# Altium footprint library Napelem_Inverter.PcbLib: 127 footprints (part 2 of 8)
Each footprint in its own frame and in the unit in brackets; x right, y up, seen from the top. Pads: shape width x height; smd on the part's side, far side on the other; paste and mask are expansions set on the pad; w line width, h text height; cw(c..) or ccw(c..) is an arc to the next point about the centre after c.
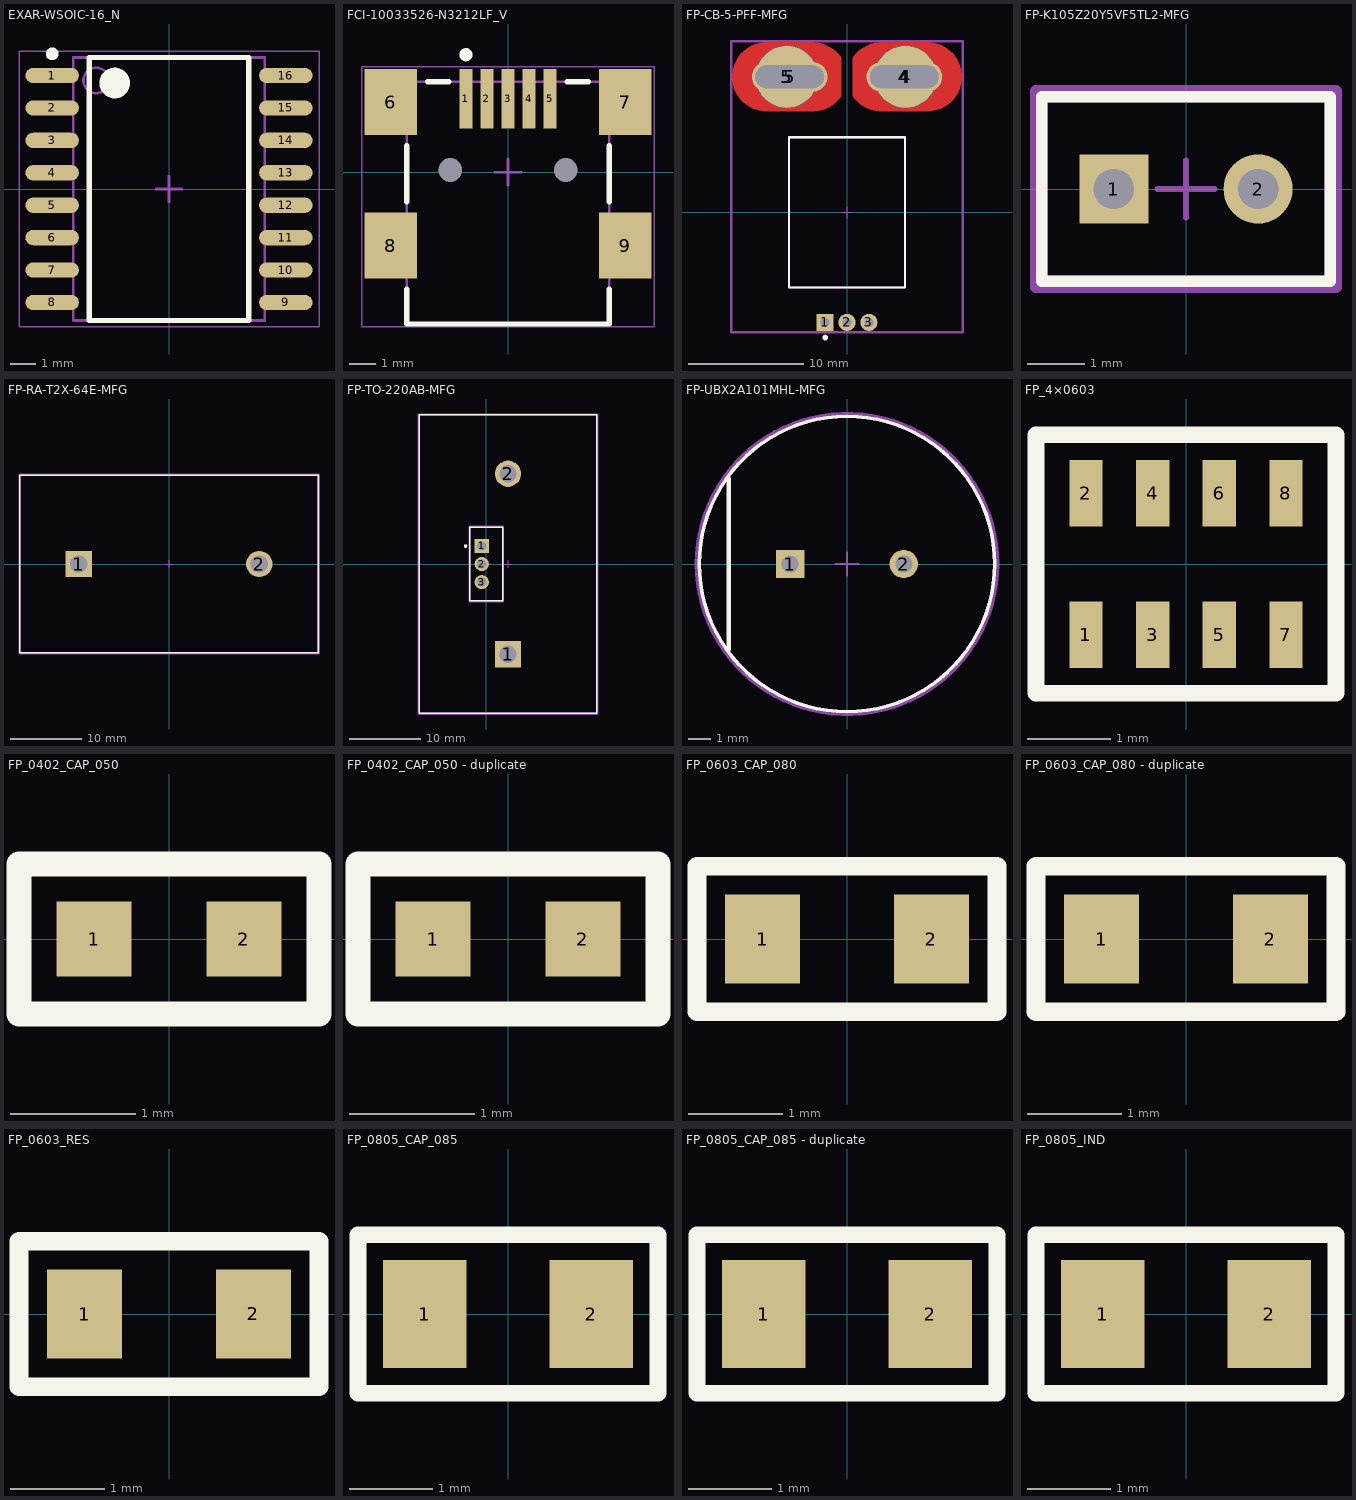
[diagram p1: the footprints below, top view; thin cyan lines are the x and y axes]

## EXAR-WSOIC-16_N [mm] "SOIC, 16-Leads, Body 10.30x7.50mm, Pitch 1.27mm, IPC Medium Density"
height 2.65
pads (16):
  oval 2.1x0.6 smd: 1(-4.575,4.445) 2(-4.575,3.175) 3(-4.575,1.905) 4(-4.575,0.635) 5(-4.575,-0.635) 6(-4.575,-1.905) 7(-4.575,-3.175) 8(-4.575,-4.445) 9(4.575,-4.445) 10(4.575,-3.175) 11(4.575,-1.905) 12(4.575,-0.635) 13(4.575,0.635) 14(4.575,1.905) 15(4.575,3.175) 16(4.575,4.445)
Top Overlay:
  circle w0.6: c-2.125,4.15 r0.3
  circle w0.25: c-4.575,5.295 r0.125
  lines w0.2: -3.125,-5.15 3.125,-5.15 3.125,5.15 -3.125,5.15 -3.125,-5.15
Mechanical 13:
  circle w0.1: c-2.85,4.25 r0.5
  lines w0.1: -3.75,-5.15 3.75,-5.15 3.75,5.15 -3.75,5.15 -3.75,-5.15
Mechanical 15:
  lines w0.05: -5.875,-5.4 5.875,-5.4 5.875,5.4 -5.875,5.4 -5.875,-5.4
  lines w0.1: -0.5,0 0.5,0 ; 0,-0.5 0,0.5
3D body: height 2.65, standoff 0.1, extent -3.75,-5.15 3.75,5.15

## FCI-10033526-N3212LF_V [mm] "SMD, 5-Leads, Body 9.2x7.7mm, Pitch 0.8mm"
height 3.95
pads (11):
  rect 0.5x2.25 smd: 1(-1.6,2.788) 2(-0.8,2.788) 3(0,2.788) 4(0.8,2.788) 5(1.6,2.788)
  rect 2x2.5 smd: 6(-4.45,2.663) 7(4.45,2.663) 8(-4.45,-2.787) 9(4.45,-2.787)
  round 0 hole 0.9 unplated: MH1(-2.2,0.083) MH2(2.2,0.083)
Top Overlay:
  circle w0.25: c-1.6,4.463 r0.125
  lines w0.2: -3.85,-4.437 -3.85,-5.767 3.85,-5.767 3.85,-4.437 ; -3.85,-1.137 -3.85,1.013 ; -3.05,3.433 -2.25,3.433 ; 2.25,3.433 3.05,3.433 ; 3.85,-1.137 3.85,1.013
Mechanical 13:
  lines w0.1: -3.85,-5.767 3.85,-5.767 3.85,3.433 -3.85,3.433 -3.85,-5.767
Mechanical 15:
  lines w0.05: -5.55,-5.867 -5.55,4.013 5.55,4.013 5.55,-5.867 -5.55,-5.867
  lines w0.1: -0.5,0 0.5,0 ; 0,-0.5 0,0.5
3D body "i10033526.stp": height 4.02, standoff -0.98, extent -4.95,-5.767 4.95,3.632

## FP-CB-5-PFF-MFG [mm]
pads (9):
  rect 1.5x1.5 hole 0.8 paste-1000 mask+0: 1(-1.91,-9.59)
  round 1.5 hole 0.8 paste-1000 mask+0: 2(0,-9.59) 3(1.91,-9.59)
  rrect100% 6.6x2.6 hole 2 slot 6 at 0 deg paste-1000 mask+0: 4(5,11.809) 5(-5,11.809)
  round 5.4 smd paste-1000 mask+0: 4(5.099,11.809) 5(-5.25,11.809)
  round 5.4 smd far side paste-1000 mask+0: 4(5.099,11.809) 5(-5.25,11.809)
Top Layer:
  region: -0.5,10.151 -0.602,9.997 -0.843,9.716 -1.116,9.467 -1.418,9.254 -1.744,9.079 -2.089,8.945 -2.448,8.855 -2.815,8.81 -3,8.81 -7,8.809 -7.236,8.809 -7.703,8.883 -8.152,9.029 -8.572,9.244 -8.954,9.521 -9.288,9.855 -9.566,10.237 -9.78,10.658 -9.926,11.107 -10,11.573 -10,12.046 -9.926,12.512 -9.78,12.961 -9.566,13.382 -9.288,13.764 -8.954,14.098 -8.572,14.375 -8.152,14.59 -7.703,14.736 -7.236,14.809 -7,14.809 -7,14.81 -3,14.809 -2.815,14.809 -2.448,14.764 -2.089,14.674 -1.744,14.54 -1.418,14.365 -1.116,14.152 -0.843,13.903 -0.602,13.622 -0.5,13.468
  region: 0.5,13.468 0.602,13.622 0.843,13.903 1.116,14.152 1.418,14.365 1.744,14.54 2.089,14.674 2.448,14.764 2.815,14.809 3,14.809 7,14.809 7.236,14.809 7.703,14.736 8.152,14.59 8.572,14.375 8.954,14.098 9.288,13.764 9.566,13.382 9.78,12.961 9.926,12.512 10,12.046 10,11.573 9.926,11.107 9.78,10.658 9.566,10.237 9.288,9.855 8.954,9.521 8.572,9.244 8.152,9.029 7.703,8.883 7.236,8.809 7,8.809 3,8.809 2.815,8.809 2.448,8.855 2.089,8.945 1.744,9.079 1.418,9.254 1.116,9.467 0.843,9.716 0.602,9.997 0.5,10.151
Top Overlay:
  circle w0.25: c-1.9,-10.916 r0.125
  lines w0.2: -5.05,-6.55 -5.05,6.55 5.05,6.55 5.05,-6.55 -5.05,-6.55
Mechanical 5:
  lines w0.2: -10.099,-10.44 -10.099,14.91 10.099,14.91 10.099,-10.44 -10.099,-10.44
  text ".Designator" at 0,2.422 h1
Mechanical 13:
  lines w0.2: -5.05,-6.55 -5.05,6.55 5.05,6.55 5.05,-6.55 -5.05,-6.55
Mechanical 15:
  lines w0.2: -10.099,-10.44 -10.099,14.91 10.099,14.91 10.099,-10.44 -10.099,-10.44
Mechanical 16:
  lines w0.1: -0.5,0 0.5,0 ; 0,-0.5 0,0.5
3D body "IC_Allegro_MicroSystems_LLC_ACS756KCB-050B-PFF-T_eec.STEP": height 0.25, standoff 0, extent -10.099,-10.44 10.099,14.91

## FP-K105Z20Y5VF5TL2-MFG [mm]
pads (2):
  rect 1.2x1.2 hole 0.7 paste-1000 mask+0: 1(-1.25,0)
  round 1.2 hole 0.7 paste-1000 mask+0: 2(1.25,0)
Top Overlay:
  lines w0.2: -2.5,-1.6 2.5,-1.6 2.5,1.6 -2.5,1.6 -2.5,-1.6
Mechanical 5:
  lines w0.2: -2.6,-1.7 2.6,-1.7 2.6,1.7 -2.6,1.7 -2.6,-1.7
  text ".Designator" at 0,-0.001 h1
Mechanical 13:
  lines w0.2: -2.5,-1.6 2.5,-1.6 2.5,1.6 -2.5,1.6 -2.5,-1.6
Mechanical 15:
  lines w0.2: -2.6,-1.7 2.6,-1.7 2.6,1.7 -2.6,1.7 -2.6,-1.7
Mechanical 16:
  lines w0.1: -0.5,0 0.5,0 ; 0,-0.5 0,0.5
3D body "Cap_Vishay_BC_Components_K105Z20Y5VF5TL2_eec.STEP": height 0.25, standoff 0, extent -2.6,-1.7 2.6,1.7

## FP-RA-T2X-64E-MFG [mm]
pads (2):
  rect 3.7x3.7 hole 2.45 paste-1000 mask+0: 1(-12.7,0)
  round 3.7 hole 2.45 paste-1000 mask+0: 2(12.7,0)
Top Overlay:
  lines w0.2: -21,-12.5 -21,12.5 21,12.5 21,-12.5 -21,-12.5
Mechanical 5:
  lines w0.2: -21.1,-12.6 -21.1,12.6 21.1,12.6 21.1,-12.6 -21.1,-12.6
  text ".Designator" at 0,-0.001 h1
Mechanical 13:
  lines w0.2: -21,-12.5 -21,12.5 21,12.5 21,-12.5 -21,-12.5
Mechanical 15:
  lines w0.2: -21.1,-12.6 -21.1,12.6 21.1,12.6 21.1,-12.6 -21.1,-12.6
Mechanical 16:
  lines w0.1: -0.5,0 0.5,0 ; 0,-0.5 0,0.5
3D body "UNK_Ohmite_RA-T2X-64E_eec.STEP": height 0.25, standoff 0, extent -21.1,-12.6 21.1,12.6

## FP-TO-220AB-MFG [mm]
pads (5):
  rect 2x2 hole 1.3 paste-1000 mask+0: 1(-0.647,2.55)
  rect 3.7x3.7 hole 2.45 paste-1000 mask+0: 1(3.048,-12.7)
  round 2 hole 1.3 paste-1000 mask+0: 2(-0.647,0) 3(-0.647,-2.55)
  round 3.7 hole 2.45 paste-1000 mask+0: 2(3.048,12.7)
Top Layer:
  region: 12.816,-13.418
  region: 12.816,-13.418
  region: 12.816,-13.418
Top Overlay:
  circle w0.25: c-2.925,2.525 r0.125
  lines w0.2: -9.452,-21 15.548,-21 15.548,21 -9.452,21 -9.452,-21 ; -2.3,-5.2 -2.3,5.2 2.3,5.2 2.3,-5.2 -2.3,-5.2
Mechanical 5:
  lines w0.2: -9.552,-21.1 15.648,-21.1 15.648,21.1 -9.552,21.1 -9.552,-21.1 ; -2.4,-5.3 -2.4,5.3 2.4,5.3 2.4,-5.3 -2.4,-5.3
  text ".Designator" at 0,-0.001 h1
  text ".Designator" at 3.049,0 h1
Mechanical 13:
  lines w0.2: -9.452,-21 15.548,-21 15.548,21 -9.452,21 -9.452,-21 ; -2.3,-5.2 -2.3,5.2 2.3,5.2 2.3,-5.2 -2.3,-5.2
Mechanical 15:
  lines w0.2: -9.552,-21.1 15.648,-21.1 15.648,21.1 -9.552,21.1 -9.552,-21.1 ; -2.4,-5.3 -2.4,5.3 2.4,5.3 2.4,-5.3 -2.4,-5.3
Mechanical 16:
  lines w0.1: -0.5,0 0.5,0 ; 0,-0.5 0,0.5 ; 2.548,0 3.548,0 ; 3.048,-0.5 3.048,0.5
3D body "Diode_STMicroelectronics_BTA24-800BWRG_eec.STEP": height 0.25, standoff 0, extent -2.4,-5.3 2.4,5.3
3D body "UNK_Ohmite_RA-T2X-64E_eec.STEP": height 0.25, standoff 0, extent -9.552,-21.1 15.648,21.1

## FP-UBX2A101MHL-MFG [mm]
pads (2):
  rect 1.25x1.25 hole 0.75 paste-1000 mask+0: 1(-2.5,0)
  round 1.25 hole 0.75 paste-1000 mask+0: 2(2.5,0)
Top Overlay:
  circle w0.15: c0,0 r6.5
  lines w0.2: -5.2,-3.75 -5.2,3.75
Mechanical 5:
  text ".Designator" at 0,0.188 h1
Mechanical 13:
  circle w0.15: c0,0 r6.5
Mechanical 15:
  lines w0.2: -6.6,0 ccw(c0,0) 6.6,0 ccw(c0,0) -6.6,0
Mechanical 16:
  lines w0.1: -0.5,0 0.5,0 ; 0,-0.5 0,0.5
3D body "Cap_Nichicon_UBX2A101MHL_eec.STEP": height 0.25, standoff 0, extent -6.6,-6.6 6.6,6.6

## FP_4×0603 [mm] "4×0603-as ellenállásháló"
pads (8):
  rect 0.4x0.8 smd: 1(-1.2,-0.85) 2(-1.2,0.85) 3(-0.4,-0.85) 4(-0.4,0.85) 5(0.4,-0.85) 6(0.4,0.85) 7(1.2,-0.85) 8(1.2,0.85)
Top Overlay:
  lines w0.2: -1.8,-1.55 1.8,-1.55 1.8,1.55 -1.8,1.55 -1.8,-1.55
3D body "RN164P.STEP": height 0.55, standoff 0, extent -1.6,-0.8 1.6,0.8

## FP_0402_CAP_050 [mm] "0.5mm magas 0402 kapacitás"
height 0.55
pads (2):
  rect 0.6x0.6 smd: 1(-0.6,0) 2(0.6,0)
Top Overlay:
  lines w0.2: -1.2,-0.6 -1.2,0.6 1.2,0.6 1.2,-0.6 -1.2,-0.6
3D body: height 0.5, standoff 0, extent -0.3,-0.25 0.3,0.25
3D body: height 0.5, standoff 0, extent 0.3,-0.25 0.5,0.25
3D body: height 0.5, standoff 0, extent -0.5,-0.25 -0.3,0.25

## FP_0402_CAP_050 - duplicate [mm] "0.5mm magas 0402 kapacitás"
height 0.55
pads (2):
  rect 0.6x0.6 smd: 1(-0.6,0) 2(0.6,0)
Top Overlay:
  lines w0.2: -1.2,-0.6 1.2,-0.6 1.2,0.6 -1.2,0.6 -1.2,-0.6
3D body: height 0.5, standoff 0, extent -0.5,-0.25 -0.3,0.25
3D body: height 0.5, standoff 0, extent 0.3,-0.25 0.5,0.25
3D body: height 0.5, standoff 0, extent -0.3,-0.25 0.3,0.25

## FP_0603_CAP_080 [mm] "0.8mm magas 0603 kapacitás"
height 0.9
pads (2):
  rect 0.8x0.95 smd: 1(-0.9,0) 2(0.9,0)
Top Overlay:
  lines w0.2: 1.225,-0.775 -1.225,-0.775 ; -1.225,-0.775 1.6,-0.775 1.6,0.775 1.225,0.775 -1.225,0.775 -1.6,0.775 -1.6,-0.775 -1.225,-0.775
3D body: height 0.8, standoff 0, extent -0.8,-0.4 -0.5,0.4
3D body: height 0.8, standoff 0, extent 0.5,-0.4 0.762,0.4
3D body: height 0.8, standoff 0, extent -0.5,-0.4 0.5,0.4

## FP_0603_CAP_080 - duplicate [mm] "0.8mm magas 0603 kapacitás"
height 0.9
pads (2):
  rect 0.8x0.95 smd: 1(-0.9,0) 2(0.9,0)
Top Overlay:
  lines w0.2: 1.225,-0.775 -1.225,-0.775 ; -1.225,-0.775 -1.6,-0.775 -1.6,0.775 -1.225,0.775 1.225,0.775 1.6,0.775 1.6,-0.775 -1.225,-0.775
3D body: height 0.8, standoff 0, extent -0.5,-0.4 0.5,0.4
3D body: height 0.8, standoff 0, extent 0.5,-0.4 0.762,0.4
3D body: height 0.8, standoff 0, extent -0.8,-0.4 -0.5,0.4

## FP_0603_RES [mm] "0603 ellenállás"
height 0.55
pads (2):
  rect 0.8x0.95 smd: 1(-0.9,0) 2(0.9,0)
Top Overlay:
  lines w0.2: -1.6,-0.775 -1.6,0.775 -1.225,0.775 1.225,0.775 1.6,0.775 1.6,-0.775 1.225,-0.775 -1.225,-0.775 -1.6,-0.775
3D body "0603RES.STEP": height 0.44, standoff -0.01, extent -0.8,-0.4 0.8,0.4

## FP_0805_CAP_085 [mm] "0805 kapacitás YAGEO 0.85mm magas"
height 0.86
pads (2):
  rect 1x1.3 smd: 1(-1,0) 2(1,0)
Top Overlay:
  lines w0.2: -1.8,-0.95 -1.8,0.95 1.8,0.95 1.8,-0.95 -1.8,-0.95
3D body: height 0.85, standoff 0, extent -0.644,-0.635 0.676,0.635
3D body: height 0.85, standoff 0, extent 0.676,-0.635 1.032,0.635
3D body: height 0.85, standoff 0, extent -1,-0.635 -0.644,0.635

## FP_0805_CAP_085 - duplicate [mm] "0805 kapacitás YAGEO 0.85mm magas"
height 0.86
pads (2):
  rect 1x1.3 smd: 1(-1,0) 2(1,0)
Top Overlay:
  lines w0.2: -1.8,-0.95 -1.8,0.95 1.8,0.95 1.8,-0.95 -1.8,-0.95
3D body: height 0.85, standoff 0, extent -0.644,-0.635 0.676,0.635
3D body: height 0.85, standoff 0, extent 0.676,-0.635 1.032,0.635
3D body: height 0.85, standoff 0, extent -1,-0.635 -0.644,0.635

## FP_0805_IND [mm] "0805 power inductor"
height 1.45
pads (2):
  rect 1x1.3 smd: 1(-1,0) 2(1,0)
Top Overlay:
  lines w0.2: -1.8,-0.95 1.8,-0.95 1.8,0.95 -1.8,0.95 -1.8,-0.95
3D body: height 1.25, standoff 0, extent -1,-0.635 -0.644,0.635
3D body: height 1.25, standoff 0, extent 0.676,-0.635 1.032,0.635
3D body: height 1.25, standoff 0, extent -0.644,-0.635 0.676,0.635